# Altium footprint library fszhang.PcbLib: 1032 footprints (part 52 of 66)
Each footprint in its own frame and in the unit in brackets; x right, y up, seen from the top. Pads: shape width x height; smd on the part's side, far side on the other; paste and mask are expansions set on the pad; w line width, h text height; cw(c..) or ccw(c..) is an arc to the next point about the centre after c.
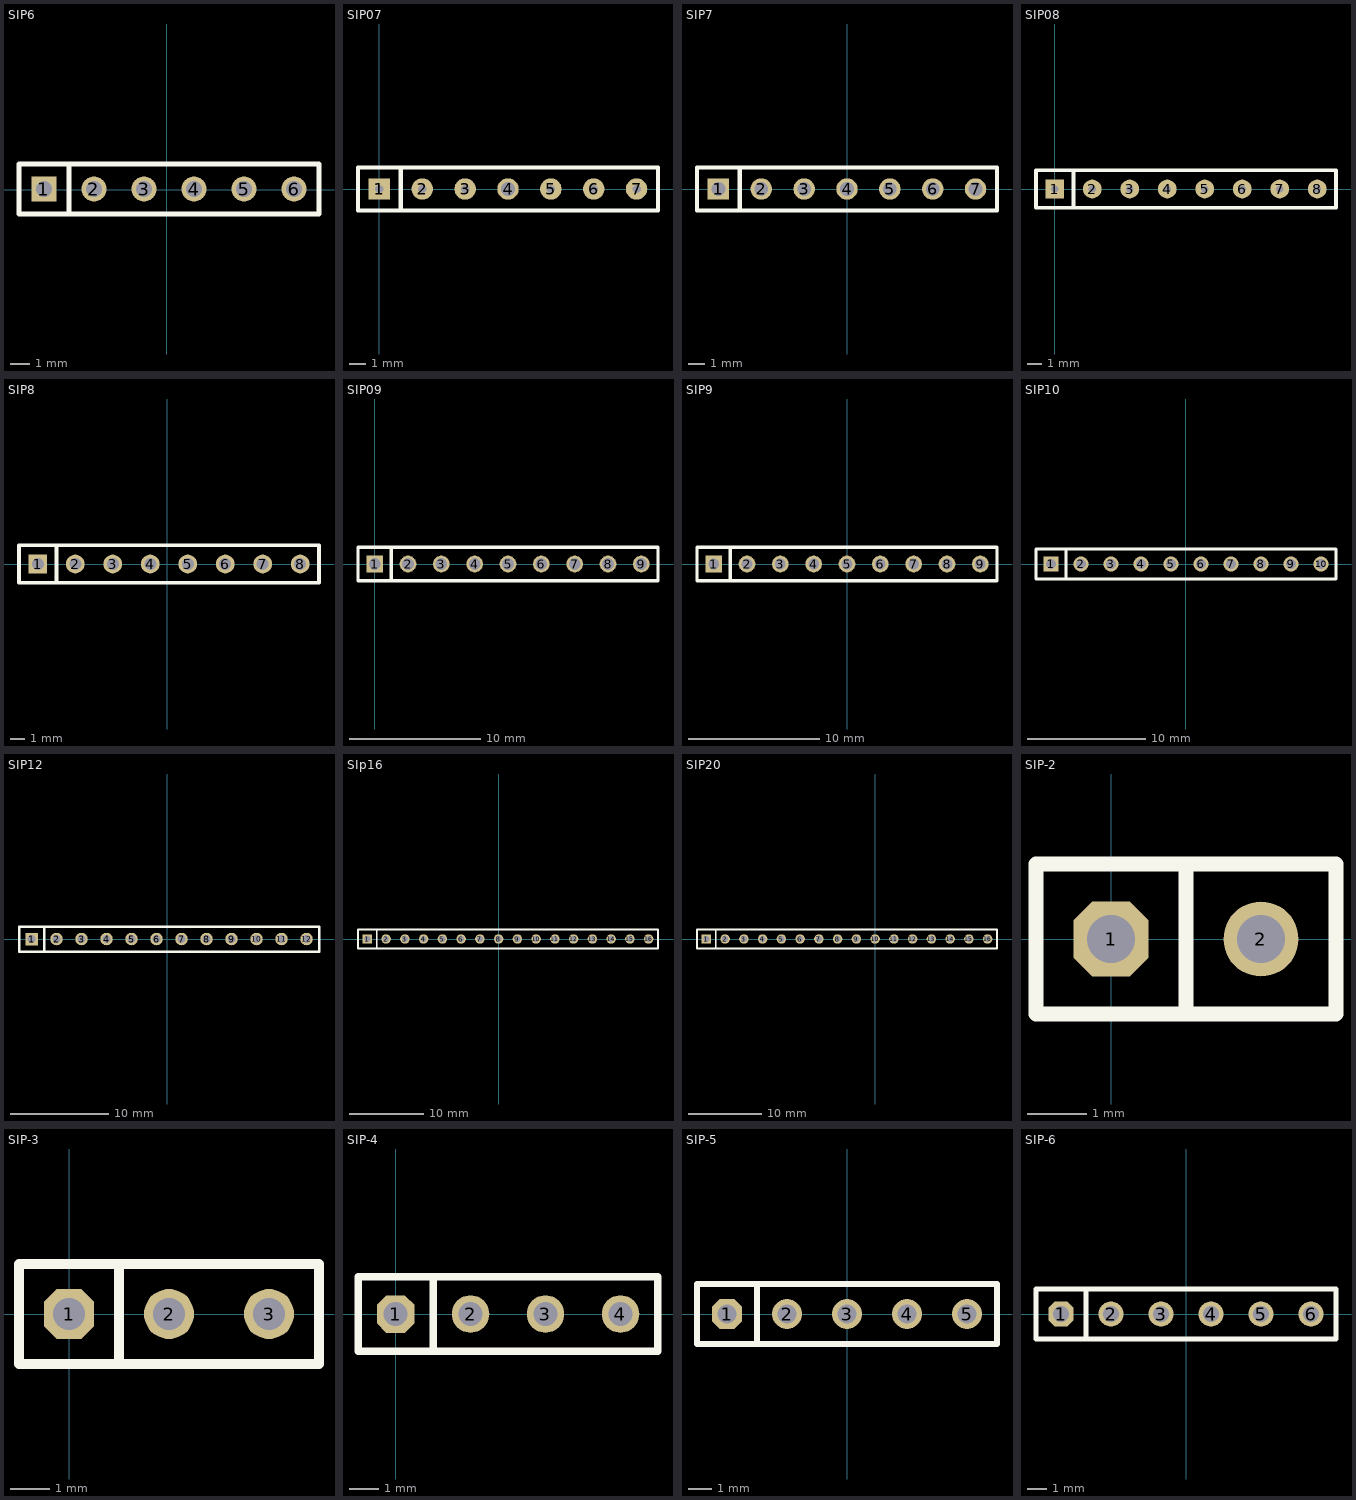
[diagram p51: the footprints below, top view; thin cyan lines are the x and y axes]

## SIP6 [mil]
pads (6):
  rect 50x50 hole 32: 1(-245.98,1.57)
  round 50 hole 32: 2(-145.98,1.57) 3(-45.98,1.57) 4(54.02,1.57) 5(154.02,1.57) 6(254.02,1.57)
Top Overlay:
  lines w10: -195.98,-48.42 -195.98,51.58 ; -295.98,-48.42 -295.98,51.58 304.02,51.58 304.02,-48.42 -295.98,-48.42

## SIP07 [mm]
pads (7):
  rect 1.27x1.27 hole 0.5: 1(0,0)
  round 1.27 hole 0.5: 2(2.54,0) 3(5.08,0) 5(10.16,0) 6(12.7,0) 7(15.24,0)
  round 1.27 hole 0.813: 4(7.62,0)
Top Overlay:
  lines w0.254: 1.27,-1.27 1.27,1.27 ; -1.27,-1.27 -1.27,1.27 16.51,1.27 16.51,-1.27 -1.27,-1.27

## SIP7 [mil]
pads (7):
  rect 50x50 hole 32: 1(-300,0)
  round 50 hole 32: 2(-200,0) 3(-100,0) 4(0,0) 5(100,0) 6(200,0) 7(300,0)
Top Overlay:
  lines w10: -250,-50 -250,50 ; -350,-50 350,-50 350,50 -350,50 -350,-50

## SIP08 [mm]
pads (8):
  rect 1.27x1.27 hole 0.5: 1(0,0)
  round 1.27 hole 0.5: 2(2.54,0) 3(5.08,0) 4(7.62,0) 5(10.16,0) 6(12.7,0) 7(15.24,0) 8(17.78,0)
Top Overlay:
  lines w0.254: 1.27,-1.27 1.27,1.27 ; -1.27,-1.27 -1.27,1.27 19.05,1.27 19.05,-1.27 -1.27,-1.27

## SIP8 [mil]
pads (8):
  rect 50x50 hole 32: 1(-345.43,0.71)
  round 50 hole 32: 2(-245.43,0.71) 3(-145.43,0.71) 4(-45.43,0.71) 5(54.57,0.71) 6(154.57,0.71) 7(254.57,0.71) 8(354.57,0.71)
Top Overlay:
  lines w10: -295.43,-49.29 -295.43,50.71 ; -395.43,-49.29 -395.43,50.71 404.57,50.71 404.57,-49.29 -395.43,-49.29

## SIP09 [mm]
pads (9):
  rect 1.27x1.27 hole 0.9: 1(0,0)
  round 1.27 hole 0.9: 2(2.54,0) 3(5.08,0) 4(7.62,0) 5(10.16,0) 6(12.7,0) 7(15.24,0) 8(17.78,0) 9(20.32,0)
Top Overlay:
  lines w0.254: 1.27,-1.27 1.27,1.27 ; -1.27,-1.27 21.59,-1.27 21.59,1.27 -1.27,1.27 -1.27,-1.27

## SIP9 [mil]
pads (9):
  rect 50x50 hole 32: 1(-400,0)
  round 50 hole 32: 2(-300,0) 3(-200,0) 4(-100,0) 5(0,0) 6(100,0) 7(200,0) 8(300,0) 9(400,0)
Top Overlay:
  lines w10: -350,-50 -350,50 ; -450,-50 -450,50 450,50 450,-50 -450,-50

## SIP10 [mil]
pads (10):
  rect 50x50 hole 32: 1(-449.37,0)
  round 50 hole 32: 2(-349.37,0) 3(-249.37,0) 4(-149.37,0) 5(-49.37,0) 6(50.63,0) 7(150.63,0) 8(250.63,0) 9(350.63,0) 10(450.63,0)
Top Overlay:
  lines w10: -399.37,-50 -399.37,50 ; -499.37,-50 -499.37,50 500.63,50 500.63,-50 -499.37,-50

## SIP12 [mil]
pads (12):
  rect 50x50 hole 32: 1(-543.31,1.42)
  round 50 hole 32: 2(-443.31,1.42) 3(-343.31,1.42) 4(-243.31,1.42) 5(-143.31,1.42) 6(-43.31,1.42) 7(56.69,1.42) 8(156.69,1.42) 9(256.69,1.42) 10(356.69,1.42) 11(456.69,1.42) 12(556.69,1.42)
Top Overlay:
  lines w10: -493.31,-48.58 -493.31,51.42 ; -593.31,-48.58 606.69,-48.58 606.69,51.42 -593.31,51.42 -593.31,-48.58

## SIp16 [mil]
pads (16):
  rect 50x50 hole 32: 1(-700,0)
  round 50 hole 32: 2(-600,0) 3(-500,0) 4(-400,0) 5(-300,0) 6(-200,0) 7(-100,0) 8(0,0) 9(100,0) 10(200,0) 11(300,0) 12(400,0) 13(500,0) 14(600,0) 15(700,0) 16(800,0)
Top Overlay:
  lines w10: -650,-50 -650,50 ; -750,-50 -750,50 850,50 850,-50 -750,-50

## SIP20 [mil]
pads (16):
  rect 50x50 hole 32: 1(-900,0)
  round 50 hole 32: 2(-800,0) 3(-700,0) 4(-600,0) 5(-500,0) 6(-400,0) 7(-300,0) 8(-200,0) 9(-100,0) 10(0,0) 11(100,0) 12(200,0) 13(300,0) 14(400,0) 15(500,0) 16(600,0)
Top Overlay:
  lines w10: -850,-50 -850,50 ; -950,-50 -950,50 650,50 650,-50 -950,-50

## SIP-2 [mil]
pads (2):
  oct 50x50 hole 32: 1(0,0)
  round 50 hole 32: 2(100,0)
Top Overlay:
  lines w10: 50,-50 50,50 ; -50,-50 -50,50 150,50 150,-50 -50,-50

## SIP-3 [mil]
pads (3):
  oct 50x50 hole 32: 1(0,0)
  round 50 hole 32: 2(100,0) 3(200,0)
Top Overlay:
  lines w10: 50,-50 50,50 ; -50,-50 250,-50 250,50 -50,50 -50,-50

## SIP-4 [mil]
pads (4):
  oct 50x50 hole 32: 1(0,0)
  round 50 hole 32: 2(100,0) 3(200,0) 4(300,0)
Top Overlay:
  lines w10: 50,-50 50,50 ; -50,-50 -50,50 350,50 350,-50 -50,-50

## SIP-5 [mil]
pads (5):
  oct 50x50 hole 32: 1(-200,0)
  round 50 hole 32: 2(-100,0) 3(0,0) 4(100,0) 5(200,0)
Top Overlay:
  lines w10: -150,-50 -150,50 ; -250,-50 250,-50 250,50 -250,50 -250,-50

## SIP-6 [mil]
pads (6):
  oct 50x50 hole 32: 1(-250,0)
  round 50 hole 32: 2(-150,0) 3(-50,0) 4(50,0) 5(150,0) 6(250,0)
Top Overlay:
  lines w10: -200,-50 -200,50 ; -300,-50 -300,50 300,50 300,-50 -300,-50